# Altium footprint library FOOTPRINT.PcbLib: 132 footprints (part 8 of 9)
Each footprint in its own frame and in the unit in brackets; x right, y up, seen from the top. Pads: shape width x height; smd on the part's side, far side on the other; paste and mask are expansions set on the pad; w line width, h text height; cw(c..) or ccw(c..) is an arc to the next point about the centre after c.
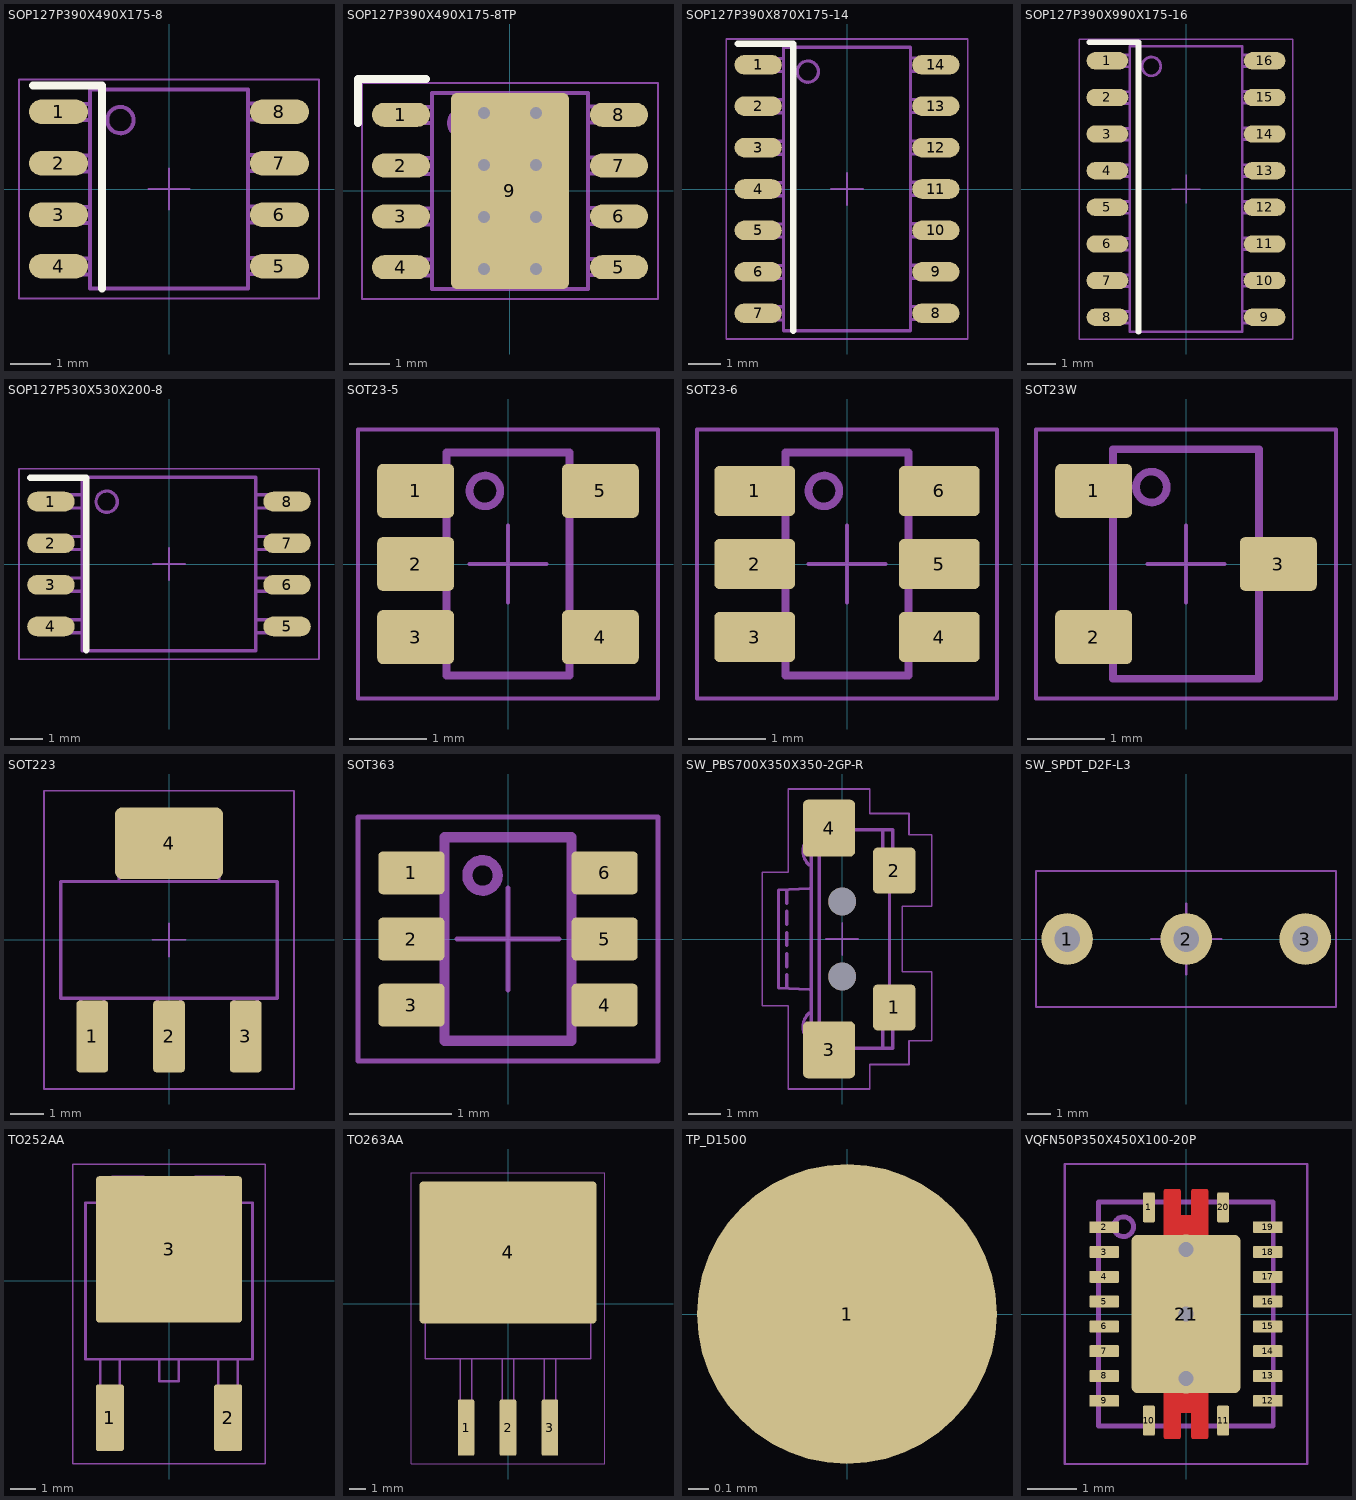
[diagram p7: the footprints below, top view; thin cyan lines are the x and y axes]

## SOP127P390X490X175-8 [mm] "Small Outline Package, 8-pin, 3.9x4.9mm"
height 1.75
pads (8):
  oval 1.45x0.6 smd: 1(-2.725,1.905) 2(-2.725,0.635) 3(-2.725,-0.635) 4(-2.725,-1.905) 5(2.725,-1.905) 6(2.725,-0.635) 7(2.725,0.635) 8(2.725,1.905)
Top Overlay:
  lines w0.2: -3.35,2.55 -1.65,2.55 -1.65,-2.45
Top Assembly:
  circle w0.1: c-1.2,1.7 r0.325
  lines w0.1: -1.95,-2.11 -3,-2.11 -3,-1.71 -1.95,-1.71 ; -1.95,-0.84 -3,-0.84 -3,-0.44 -1.95,-0.44 ; -1.95,0.43 -3,0.43 -3,0.83 -1.95,0.83 ; -1.95,1.7 -3,1.7 -3,2.1 -1.95,2.1 ; 1.95,-2.1 3,-2.1 3,-1.7 1.95,-1.7 ; 1.95,-0.83 3,-0.83 3,-0.43 1.95,-0.43 ; 1.95,0.44 3,0.44 3,0.84 1.95,0.84 ; 1.95,1.71 3,1.71 3,2.11 1.95,2.11 ; -1.95,-2.45 -1.95,2.45 1.95,2.45 1.95,-2.45 -1.95,-2.45
Top Courtyard:
  lines w0.05: -3.7,-2.7 3.7,-2.7 3.7,2.7 -3.7,2.7 -3.7,-2.7
Top Component Center:
  lines w0.05: -0.5,0 0.5,0 ; 0,-0.5 0,0.5
Top Designator:
  text "'.Comment'" at 0.81,-1.425 h0.65
  text "'.Designator'" at -0.351,-1.425 h0.65
3D body "SOIC-8_3.9x4.9mm_P1.27mm.step": height 1.75, standoff 0, extent -3,-2.45 3,2.45

## SOP127P390X490X175-8TP [mm] "Small Outline Package, Thermal Pad, 8-pin, 3.9x4.9mm"
height 1.75
pads (9):
  oval 1.45x0.6 smd: 1(-2.725,1.905) 2(-2.725,0.635) 3(-2.725,-0.635) 4(-2.725,-1.905) 5(2.725,-1.905) 6(2.725,-0.635) 7(2.725,0.635) 8(2.725,1.905)
  rrect10% 2.95x4.9 smd paste-100 mask-100: 9(0,0)
via 0.65,-1.95 diameter 0.6 hole 0.3
via -0.65,-1.95 diameter 0.6 hole 0.3
via -0.65,1.95 diameter 0.6 hole 0.3
via 0.65,1.95 diameter 0.6 hole 0.3
via 0.65,-0.65 diameter 0.6 hole 0.3
via -0.65,-0.65 diameter 0.6 hole 0.3
via -0.65,0.65 diameter 0.6 hole 0.3
via 0.65,0.65 diameter 0.6 hole 0.3
Top Overlay:
  lines w0.2: -3.8,1.7 -3.8,2.8 -2.1,2.8
Top Paste:
  region: -1.1,-1.55 1.1,-1.55 1.14,-1.55 1.213,-1.52 1.27,-1.463 1.3,-1.39 1.3,-1.35 1.3,1.35 1.3,1.39 1.27,1.463 1.213,1.52 1.14,1.55 1.1,1.55 -1.1,1.55 -1.14,1.55 -1.213,1.52 -1.27,1.463 -1.3,1.39 -1.3,1.35 -1.3,-1.35 -1.3,-1.39 -1.27,-1.463 -1.213,-1.52 -1.14,-1.55
Top Solder:
  region: -1.1,-1.55 1.1,-1.55 1.14,-1.55 1.213,-1.52 1.27,-1.463 1.3,-1.39 1.3,-1.35 1.3,1.35 1.3,1.39 1.27,1.463 1.213,1.52 1.14,1.55 1.1,1.55 -1.1,1.55 -1.14,1.55 -1.213,1.52 -1.27,1.463 -1.3,1.39 -1.3,1.35 -1.3,-1.35 -1.3,-1.39 -1.27,-1.463 -1.213,-1.52 -1.14,-1.55
Top Assembly:
  circle w0.1: c-1.2,1.7 r0.325
  lines w0.1: -1.95,-2.11 -3,-2.11 -3,-1.71 -1.95,-1.71 ; -1.95,-0.84 -3,-0.84 -3,-0.44 -1.95,-0.44 ; -1.95,0.43 -3,0.43 -3,0.83 -1.95,0.83 ; -1.95,1.7 -3,1.7 -3,2.1 -1.95,2.1 ; 1.95,-2.1 3,-2.1 3,-1.7 1.95,-1.7 ; 1.95,-0.83 3,-0.83 3,-0.43 1.95,-0.43 ; 1.95,0.44 3,0.44 3,0.84 1.95,0.84 ; 1.95,1.71 3,1.71 3,2.11 1.95,2.11 ; -1.95,-2.45 1.95,-2.45 1.95,2.45 -1.95,2.45 -1.95,-2.45
Top Courtyard:
  lines w0.05: -3.7,-2.7 -3.7,2.7 3.7,2.7 3.7,-2.7 -3.7,-2.7
Top Component Center:
  lines w0.05: -0.5,0 0.5,0 ; 0,-0.5 0,0.5
Top Designator:
  text "'.Designator'" at -0.351,-1.425 h0.65
  text "'.Comment'" at 0.81,-1.425 h0.65
3D body "SOIC-8_3.9x4.9mm_P1.27mm.step": height 1.75, standoff 0, extent -3,-2.45 3,2.45

## SOP127P390X870X175-14 [mm] "Small Outline Package, 14-pin, 3.9x8.7mm"
height 1.75
pads (14):
  oval 1.45x0.6 smd: 1(-2.725,3.81) 2(-2.725,2.54) 3(-2.725,1.27) 4(-2.725,0) 5(-2.725,-1.27) 6(-2.725,-2.54) 7(-2.725,-3.81) 8(2.725,-3.81) 9(2.725,-2.54) 10(2.725,-1.27) 11(2.725,0) 12(2.725,1.27) 13(2.725,2.54) 14(2.725,3.81)
Top Overlay:
  lines w0.2: -3.35,4.455 -1.65,4.455 -1.65,-4.35
Top Assembly:
  circle w0.1: c-1.2,3.6 r0.325
  lines w0.1: -1.95,-4.015 -3,-4.015 -3,-3.615 -1.95,-3.615 ; -1.95,-2.745 -3,-2.745 -3,-2.345 -1.95,-2.345 ; -1.95,-1.475 -3,-1.475 -3,-1.075 -1.95,-1.075 ; -1.95,-0.205 -3,-0.205 -3,0.195 -1.95,0.195 ; -1.95,1.065 -3,1.065 -3,1.465 -1.95,1.465 ; -1.95,2.335 -3,2.335 -3,2.735 -1.95,2.735 ; -1.95,3.605 -3,3.605 -3,4.005 -1.95,4.005 ; 1.95,-4.005 3,-4.005 3,-3.605 1.95,-3.605 ; 1.95,-2.735 3,-2.735 3,-2.335 1.95,-2.335 ; 1.95,-1.465 3,-1.465 3,-1.065 1.95,-1.065 ; 1.95,-0.195 3,-0.195 3,0.205 1.95,0.205 ; 1.95,1.075 3,1.075 3,1.475 1.95,1.475 ; 1.95,2.345 3,2.345 3,2.745 1.95,2.745 ; 1.95,3.615 3,3.615 3,4.015 1.95,4.015 ; -1.95,-4.35 -1.95,4.35 1.95,4.35 1.95,-4.35 -1.95,-4.35
Top Courtyard:
  lines w0.05: -3.7,-4.6 3.7,-4.6 3.7,4.6 -3.7,4.6 -3.7,-4.6
Top Component Center:
  lines w0.05: -0.5,0 0.5,0 ; 0,-0.5 0,0.5
Top Designator:
  text "'.Comment'" at 0.81,-1.425 h0.65
  text "'.Designator'" at -0.351,-1.425 h0.65
3D body "SOIC-14_3.9x8.7mm_P1.27mm.step": height 1.75, standoff 0, extent -3,-4.35 3,4.35

## SOP127P390X990X175-16 [mm] "Small Outline Package, 16-pin, 3.9x9.9mm"
height 1.75
pads (16):
  oval 1.45x0.6 smd: 1(-2.725,4.445) 2(-2.725,3.175) 3(-2.725,1.905) 4(-2.725,0.635) 5(-2.725,-0.635) 6(-2.725,-1.905) 7(-2.725,-3.175) 8(-2.725,-4.445) 9(2.725,-4.445) 10(2.725,-3.175) 11(2.725,-1.905) 12(2.725,-0.635) 13(2.725,0.635) 14(2.725,1.905) 15(2.725,3.175) 16(2.725,4.445)
Top Overlay:
  lines w0.2: -3.35,5.09 -1.65,5.09 -1.65,-4.95
Top Assembly:
  circle w0.1: c-1.2,4.25 r0.325
  lines w0.1: -1.95,-4.65 -3,-4.65 -3,-4.25 -1.95,-4.25 ; -1.95,-3.38 -3,-3.38 -3,-2.98 -1.95,-2.98 ; -1.95,-2.11 -3,-2.11 -3,-1.71 -1.95,-1.71 ; -1.95,-0.84 -3,-0.84 -3,-0.44 -1.95,-0.44 ; -1.95,0.43 -3,0.43 -3,0.83 -1.95,0.83 ; -1.95,1.7 -3,1.7 -3,2.1 -1.95,2.1 ; -1.95,2.97 -3,2.97 -3,3.37 -1.95,3.37 ; -1.95,4.24 -3,4.24 -3,4.64 -1.95,4.64 ; 1.95,-4.64 3,-4.64 3,-4.24 1.95,-4.24 ; 1.95,-3.37 3,-3.37 3,-2.97 1.95,-2.97 ; 1.95,-2.1 3,-2.1 3,-1.7 1.95,-1.7 ; 1.95,-0.83 3,-0.83 3,-0.43 1.95,-0.43 ; 1.95,0.44 3,0.44 3,0.84 1.95,0.84 ; 1.95,1.71 3,1.71 3,2.11 1.95,2.11 ; 1.95,2.98 3,2.98 3,3.38 1.95,3.38 ; 1.95,4.25 3,4.25 3,4.65 1.95,4.65 ; -1.95,-4.95 1.95,-4.95 1.95,4.95 -1.95,4.95 -1.95,-4.95
Top Courtyard:
  lines w0.05: -3.7,-5.2 -3.7,5.2 3.7,5.2 3.7,-5.2 -3.7,-5.2
Top Component Center:
  lines w0.05: -0.5,0 0.5,0 ; 0,-0.5 0,0.5
Top Designator:
  text "'.Designator'" at -0.351,-1.425 h0.65
  text "'.Comment'" at 0.81,-1.425 h0.65
3D body "SOIC-16_3.9x9.9mm_P1.27mm.step": height 1.75, standoff 0, extent -3,-4.95 3,4.95

## SOP127P530X530X200-8 [mm] "Small Outline Package, 8-pin, 5.30x5.30mm"
height 2
pads (8):
  oval 1.45x0.6 smd: 1(-3.6,1.905) 2(-3.6,0.635) 3(-3.6,-0.635) 4(-3.6,-1.905) 5(3.6,-1.905) 6(3.6,-0.635) 7(3.6,0.635) 8(3.6,1.905)
Top Overlay:
  lines w0.2: -4.225,2.625 -2.525,2.625 -2.525,-2.625
Top Assembly:
  circle w0.1: c-1.9,1.9 r0.325
  lines w0.1: -2.65,-2.1 -3.95,-2.1 -3.95,-1.7 -2.65,-1.7 ; -2.65,-0.83 -3.95,-0.83 -3.95,-0.43 -2.65,-0.43 ; -2.65,0.44 -3.95,0.44 -3.95,0.84 -2.65,0.84 ; -2.65,1.71 -3.95,1.71 -3.95,2.11 -2.65,2.11 ; 2.65,-2.1 3.95,-2.1 3.95,-1.7 2.65,-1.7 ; 2.65,-0.83 3.95,-0.83 3.95,-0.43 2.65,-0.43 ; 2.65,0.44 3.95,0.44 3.95,0.84 2.65,0.84 ; 2.65,1.71 3.95,1.71 3.95,2.11 2.65,2.11 ; -2.65,-2.65 -2.65,2.65 2.65,2.65 2.65,-2.65 -2.65,-2.65
Top Courtyard:
  lines w0.05: -4.575,-2.9 4.575,-2.9 4.575,2.9 -4.575,2.9 -4.575,-2.9
Top Component Center:
  lines w0.05: -0.5,0 0.5,0 ; 0,-0.5 0,0.5
Top Designator:
  text "'.Comment'" at 0.81,-1.425 h0.65
  text "'.Designator'" at -0.351,-1.425 h0.65
3D body "SOIC-8_5.275x5.275mm_P1.27mm.step": height 2.05, standoff 0, extent -3.95,-2.637 3.95,2.638

## SOT23-5 [mm] "Small Outline Transistor, 5-Leads, Body 2.9x1.6mm"
height 1.45
pads (5):
  rrect20% 1x0.7 smd: 1(-1.2,0.95) 2(-1.2,0) 3(-1.2,-0.95) 4(1.2,-0.95) 5(1.2,0.95)
Top Assembly:
  circle w0.1: c-0.3,0.95 r0.2
  lines w0.1: -1.15,-1.15 -1.15,-0.75 ; -1.15,-0.2 -1.15,0.2 ; -1.15,0.75 -1.15,1.15 ; -0.8,-1.15 -1.35,-1.15 -1.35,-0.75 -0.8,-0.75 ; -0.8,-0.2 -1.35,-0.2 -1.35,0.2 -0.8,0.2 ; -0.8,0.75 -1.35,0.75 -1.35,1.15 -0.8,1.15 ; 0.8,-1.15 1.35,-1.15 1.35,-0.75 0.8,-0.75 ; 0.8,0.75 1.35,0.75 1.35,1.15 0.8,1.15 ; 1.15,-1.15 1.15,-0.75 ; 1.15,0.75 1.15,1.15 ; -0.8,-1.45 -0.8,1.45 0.8,1.45 0.8,-1.45 -0.8,-1.45
Top Courtyard:
  lines w0.05: -1.95,-1.75 1.95,-1.75 1.95,1.75 -1.95,1.75 -1.95,-1.75
Top Component Center:
  lines w0.05: -0.5,0 0.5,0 ; 0,-0.5 0,0.5
Top Designator:
  text "'.Designator'" at -0.176,-1.325 h0.65
  text "'.Comment'" at 0.485,-1.325 h0.65
3D body "SOT-23-5.step": height 1.56, standoff 0.01, extent -1.4,-1.45 1.4,1.45

## SOT23-6 [mm] "Small Outline Transistor, 6-Leads, Body 2.9x1.6mm"
height 1.45
pads (6):
  rrect20% 1.05x0.65 smd: 1(-1.2,0.95) 2(-1.2,0) 3(-1.2,-0.95) 4(1.2,-0.95) 5(1.2,0) 6(1.2,0.95)
Top Assembly:
  circle w0.1: c-0.3,0.95 r0.2
  lines w0.1: -1.15,-1.15 -1.15,-0.75 ; -1.15,-0.2 -1.15,0.2 ; -1.15,0.75 -1.15,1.15 ; -0.8,-1.15 -1.35,-1.15 -1.35,-0.75 -0.8,-0.75 ; -0.8,-0.2 -1.35,-0.2 -1.35,0.2 -0.8,0.2 ; -0.8,0.75 -1.35,0.75 -1.35,1.15 -0.8,1.15 ; 0.8,-1.15 1.35,-1.15 1.35,-0.75 0.8,-0.75 ; 0.8,-0.2 1.35,-0.2 1.35,0.2 0.8,0.2 ; 0.8,0.75 1.35,0.75 1.35,1.15 0.8,1.15 ; 1.15,-1.15 1.15,-0.75 ; 1.15,-0.2 1.15,0.2 ; 1.15,0.75 1.15,1.15 ; -0.8,-1.45 -0.8,1.45 0.8,1.45 0.8,-1.45 -0.8,-1.45
Top Courtyard:
  lines w0.05: -1.95,-1.75 1.95,-1.75 1.95,1.75 -1.95,1.75 -1.95,-1.75
Top Component Center:
  lines w0.05: -0.5,0 0.5,0 ; 0,-0.5 0,0.5
Top Designator:
  text "'.Designator'" at -0.176,-1.375 h0.65
  text "'.Comment'" at 0.485,-1.375 h0.65
3D body "SOT-23-6.step": height 1.56, standoff 0.01, extent -1.4,-1.45 1.4,1.45

## SOT23W [mm] "Small Outline Transistor, 3-Leads, Body 2.98x1.91mm"
height 0.95
pads (3):
  rrect20% 1x0.7 smd: 1(-1.2,0.95) 2(-1.2,-0.95) 3(1.2,0)
Top Assembly:
  circle w0.1: c-0.45,1 r0.2
  lines w0.1: -1.3,-1.15 -1.3,-0.75 ; -1.3,0.75 -1.3,1.15 ; -0.95,-1.15 -1.5,-1.15 -1.5,-0.75 -0.95,-0.75 ; -0.95,0.75 -1.5,0.75 -1.5,1.15 -0.95,1.15 ; 0.95,-0.2 1.5,-0.2 1.5,0.2 0.95,0.2 ; 1.3,-0.2 1.3,0.2 ; -0.95,-1.49 0.95,-1.49 0.95,1.49 -0.95,1.49 -0.95,-1.49
Top Courtyard:
  lines w0.05: -1.95,-1.75 -1.95,1.75 1.95,1.75 1.95,-1.75 -1.95,-1.75
Top Component Center:
  lines w0.05: -0.5,0 0.5,0 ; 0,-0.5 0,0.5
Top Designator:
  text "'.Comment'" at 0.485,-1.45 h0.65
  text "'.Designator'" at -0.176,-1.45 h0.65
3D body "SOT-23W.step": height 1, standoff 0, extent -1.45,-1.49 1.45,1.49

## SOT223 [mm] "Small Outline Transistor, 4-Leads, Body 6.5x3.5mm"
height 1.6
pads (4):
  rrect20% 0.95x2.15 smd: 1(-2.3,-2.9) 2(0,-2.9) 3(2.3,-2.9)
  rrect20% 3.25x2.15 smd: 4(0,2.9)
Top Assembly:
  lines w0.1: -2.65,-2.625 -1.95,-2.625 ; -2.65,-1.75 -2.65,-3.5 -1.95,-3.5 -1.95,-1.75 ; -1.5,1.75 -1.5,3.5 1.5,3.5 1.5,1.75 ; -1.5,2.9 1.5,2.9 ; -0.35,-2.625 0.35,-2.625 ; -0.35,-1.75 -0.35,-3.5 0.35,-3.5 0.35,-1.75 ; 1.95,-2.625 2.65,-2.625 ; 1.95,-1.75 1.95,-3.5 2.65,-3.5 2.65,-1.75 ; -3.25,-1.75 -3.25,1.75 3.25,1.75 3.25,-1.75 -3.25,-1.75
Top Courtyard:
  lines w0.05: -3.75,-4.475 -3.75,4.475 3.75,4.475 3.75,-4.475 -3.75,-4.475
Top Component Center:
  lines w0.05: -0.5,0 0.5,0 ; 0,-0.5 0,0.5
Top Designator:
  text "'.Designator'" at -1.875,0.176 h0.65
  text "'.Comment'" at -1.875,-0.485 h0.65
3D body "SOT-223.step": height 1.7, standoff 0, extent -3.25,-3.5 3.25,3.5

## SOT363 [mm] "Small Outline Transistor, 6-Leads, Body 2.00x1.25mm"
height 0.95
pads (6):
  rrect20% 0.65x0.42 smd: 1(-0.95,0.65) 2(-0.95,0) 3(-0.95,-0.65) 4(0.95,-0.65) 5(0.95,0) 6(0.95,0.65)
Top Assembly:
  circle w0.1: c-0.25,0.625 r0.15
  lines w0.1: -0.85,-0.8 -0.85,-0.5 ; -0.85,-0.15 -0.85,0.15 ; -0.85,0.5 -0.85,0.8 ; -0.625,-0.8 -1,-0.8 -1,-0.5 -0.625,-0.5 ; -0.625,-0.15 -1,-0.15 -1,0.15 -0.625,0.15 ; -0.625,0.5 -1,0.5 -1,0.8 -0.625,0.8 ; 0.625,-0.8 1,-0.8 1,-0.5 0.625,-0.5 ; 0.625,-0.15 1,-0.15 1,0.15 0.625,0.15 ; 0.625,0.5 1,0.5 1,0.8 0.625,0.8 ; 0.85,-0.8 0.85,-0.5 ; 0.85,-0.15 0.85,0.15 ; 0.85,0.5 0.85,0.8 ; -0.625,-1 -0.625,1 0.625,1 0.625,-1 -0.625,-1
Top Courtyard:
  lines w0.05: -1.475,-1.2 -1.475,1.2 1.475,1.2 1.475,-1.2 -1.475,-1.2
Top Component Center:
  lines w0.05: -0.5,0 0.5,0 ; 0,-0.5 0,0.5
Top Designator:
  text "'.Designator'" at -0.176,-0.9 h0.65
  text "'.Comment'" at 0.485,-0.9 h0.65
3D body "SOT-363_SC-70-6.step": height 1.06, standoff 0.01, extent -1,-1 1,1

## SW_PBS700X350X350-2GP-R [mm] "Push Button Switch, Body 7.0x3.5mm, 2 pin GND, 2 Mounting Holes"
height 3.5
pads (6):
  rrect20% 1.3x1.4 smd: 1(1.6,-2.1) 2(1.6,2.1)
  rrect20% 1.6x1.75 smd: 3(-0.4,-3.4) 4(-0.4,3.4)
  round 0.85 hole 0.85 unplated: ""(0,-1.15) ""(0,1.15)
Top Assembly:
  lines w0.1: -1.7,-1.5 -1.7,-1.1 ; -1.7,-0.85 -1.7,-0.45 ; -1.7,-0.2 -1.7,0.2 ; -1.7,0.45 -1.7,0.85 ; -1.7,1.1 -1.7,1.5 ; -1.024,-3.124 cw(c-0.6,-2.7) -1.024,-2.276 ; -1.024,2.276 cw(c-0.6,2.7) -1.024,3.124 ; -1,-1.55 -1.95,-1.5 -1.95,1.5 -1,1.55 ; -0.7,-3.35 1.55,-3.35 1.55,-1.6 1.25,-1.6 1.25,-1.8 ; -0.7,3.35 1.55,3.35 1.55,1.6 1.25,1.6 1.25,1.8 ; 1.25,-3.35 1.25,-2.4 ; 1.25,2.4 1.25,3.35 ; 1.45,-1.6 1.45,1.6 ; 1.55,-2.4 1.85,-2.4 1.85,-1.8 1.55,-1.8 ; 1.55,1.8 1.85,1.8 1.85,2.4 1.55,2.4 ; -0.95,-3.5 ccw(c-0.55,-3.5) -0.55,-3.9 -0.15,-3.9 -0.15,-3.6 -0.6,-3.6 cw(c-0.6,-3.5) -0.7,-3.5 ; -0.95,-3.5 -0.7,-3.5 ; -0.95,-3.5 -0.95,3.5 ; -0.95,3.5 cw(c-0.55,3.5) -0.55,3.9 -0.15,3.9 -0.15,3.6 -0.6,3.6 ccw(c-0.6,3.5) -0.7,3.5 ; -0.95,3.5 -0.7,3.5 ; -0.7,-3.5 -0.7,3.5 ; 1.2,-2.4 1.35,-2.4 1.35,-1.8 1.2,-1.8 1.2,-2.4 ; 1.2,1.8 1.35,1.8 1.35,2.4 1.2,2.4 1.2,1.8
Top Courtyard:
  lines w0.05: -2.45,-2.05 -2.45,-1.5 -2.45,1.5 -2.45,2.05 -1.95,2.05 -1.65,2.05 -1.65,4.6 0.85,4.6 0.85,3.85 2.05,3.85 2.05,3.2 2.75,3.2 2.75,1 1.85,1 1.85,-1 2.75,-1 2.75,-3.125 2.05,-3.125 2.05,-3.85 1.55,-3.85 0.85,-3.85 0.85,-4.6 0.05,-4.6 -1.65,-4.6 -1.65,-2.7 -1.65,-2.05 -2.45,-2.05
Top Component Center:
  lines w0.05: -0.5,0 0.5,0 ; 0,-0.5 0,0.5
Top Designator:
  text "'.Comment'" at 1.357,-1.65 h0.65
  text "'.Designator'" at 0.746,-1.65 h0.65

## SW_SPDT_D2F-L3 [mm]
pads (3):
  round 2.2 hole 1.1: 1(-5.08,0) 2(0,0) 3(5.08,0)
Top Assembly:
  lines w0.1: -6.41,-2.9 -6.41,2.9 6.39,2.9 6.39,-2.9 -6.41,-2.9
Top Component Center:
  lines w0.1: -1.5,0 1.5,0 ; 0,-1.5 0,1.5
Top Designator:
  text "'.Comment'" at -4.025,-0.532 h0.65
  text "'.Designator'" at -4.025,0.079 h0.65
3D body "D2F-L3.STEP": height 12.4, standoff -3.3, extent -6.45,-2.9 9.718,2.9

## TO252AA [mm] "DPAK"
pads (3):
  rrect20% 1.1x2.6 smd: 1(-2.3,-5.325) 2(2.3,-5.325)
  rrect5% 5.7x5.7 smd paste-10: 3(0,1.225)
Top Paste:
  region: -2.55,-1.625 -0.25,-1.625 -0.25,0.975 -2.85,0.975 -2.85,-1.325 -2.85,-1.385 -2.804,-1.495 -2.72,-1.579 -2.61,-1.625
  region: 2.55,4.075 0.25,4.075 0.25,1.475 2.85,1.475 2.85,3.775 2.85,3.835 2.804,3.945 2.72,4.029 2.61,4.075
  region: -2.85,3.775 -2.85,1.475 -0.25,1.475 -0.25,4.075 -2.55,4.075 -2.61,4.075 -2.72,4.029 -2.804,3.945 -2.85,3.835
  region: 2.85,-1.325 2.85,0.975 0.25,0.975 0.25,-1.625 2.55,-1.625 2.61,-1.625 2.72,-1.579 2.804,-1.495 2.85,-1.385
Top Assembly:
  lines w0.1: -2.7,3.05 -2.7,3.55 -2.2,4.05 -0.975,4.05 -0.975,3.65 1.025,3.65 1.025,4.05 2.15,4.05 2.7,3.5 2.7,3.05 ; -2.675,-3.05 -2.675,-5.85 -1.925,-5.85 -1.925,-3.05 ; -0.375,-3.05 -0.375,-3.9 0.375,-3.9 0.375,-3.05 ; 1.925,-3.05 1.925,-5.85 2.675,-5.85 2.675,-3.05 ; 2.7,3.05 2.8,3.05 3.25,3.05 3.25,-3.05 -3.25,-3.05 -3.25,3.05 2.7,3.05
Top Courtyard:
  lines w0.05: -3.75,-7.125 -3.75,4.55 3.75,4.55 3.75,-7.125 -3.75,-7.125
Top Component Center:
  lines w0.05: -1,0 1,0 ; 0,-1 0,1
Top Designator:
  text "'.Comment'" at -1.35,0.49 h0.65
  text "'.Designator'" at -1.35,1.151 h0.65
3D body "TO-252-2.step": height 2.32, standoff 0, extent -3.25,-5.85 3.25,4.05

## TO263AA [mm] "DDPAK"
pads (4):
  rrect20% 1x3.4 smd: 1(-2.54,-7.5) 2(0,-7.5) 3(2.54,-7.5)
  rrect5% 10.7x8.6 smd paste-10: 4(0,3.1)
Top Paste:
  region: -5.125,7.4 -0.25,7.4 -0.25,3.35 -5.35,3.35 -5.35,7.175 -5.35,7.22 -5.316,7.302 -5.252,7.366 -5.17,7.4
  region: 5.125,7.4 0.25,7.4 0.25,3.35 5.35,3.35 5.35,7.175 5.35,7.22 5.316,7.302 5.252,7.366 5.17,7.4
  region: -5.125,-1.2 -0.25,-1.2 -0.25,2.85 -5.35,2.85 -5.35,-0.975 -5.35,-1.02 -5.316,-1.102 -5.252,-1.166 -5.17,-1.2
  region: 5.125,-1.2 0.25,-1.2 0.25,2.85 5.35,2.85 5.35,-0.975 5.35,-1.02 5.316,-1.102 5.252,-1.166 5.17,-1.2
Top Assembly:
  lines w0.1: -2.88,-3.325 -2.88,-8.55 -2.2,-8.55 -2.2,-3.325 ; -0.34,-3.325 -0.34,-8.55 0.34,-8.55 0.34,-3.325 ; 2.2,-3.325 2.2,-8.55 2.88,-8.55 2.88,-3.325 ; -5,5.325 -5,-3.325 5,-3.325 5,5.325 ; -5,5.325 -5,5.325 ; -5,5.325 -5,6.075 -3.4,6.45 3.4,6.45 5,6.075 5,5.325 ; -5,5.325 5,5.325
Top Courtyard:
  lines w0.05: -5.85,-9.7 5.85,-9.7 5.85,7.925 -5.85,7.925 -5.85,-9.7
Top Component Center:
  lines w0.05: -1,0 1,0 ; 0,-1 0,1
Top Designator:
  text "'.Comment'" at -1.35,0.49 h0.65
  text "'.Designator'" at -1.35,1.151 h0.65
3D body "TO-263-3_TabPin4.step": height 4.42, standoff 0, extent -5,-8.55 5,6.45

## TP_D1500 [mm] "Test Point, Round, D1.5mm"
pads (1):
  round 1.5 smd paste-10: 1(0,0)

## VQFN50P350X450X100-20P [mm] "VQFN20, 21-Leads, Thermal Pad, Body 3.50x4.50mm"
height 1
pads (21):
  rrect20% 0.24x0.6 smd paste+0 mask+0.07: 1(-0.75,2.15) 10(-0.75,-2.15) 11(0.75,-2.15) 20(0.75,2.15)
  rrect20% 0.6x0.24 smd paste+0 mask+0.07: 2(-1.65,1.75) 3(-1.65,1.25) 4(-1.65,0.75) 5(-1.65,0.25) 6(-1.65,-0.25) 7(-1.65,-0.75) 8(-1.65,-1.25) 9(-1.65,-1.75) 12(1.65,-1.75) 13(1.65,-1.25) 14(1.65,-0.75) 15(1.65,-0.25) 16(1.65,0.25) 17(1.65,0.75) 18(1.65,1.25) 19(1.65,1.75)
  rrect10% 2.19x3.19 smd paste-100 mask-0.07: 21(0,0)
via 0,-1.3 diameter 0.6 hole 0.3
via 0,0 diameter 0.6 hole 0.3
via 0,1.3 diameter 0.6 hole 0.3
Top:
  region: 0.405,-2.52 0.145,-2.52 0.137,-2.52 0.122,-2.514 0.111,-2.503 0.105,-2.488 0.105,-2.48 0.105,-1.995 -0.105,-1.995 -0.105,-2.48 -0.105,-2.488 -0.111,-2.503 -0.122,-2.514 -0.137,-2.52 -0.145,-2.52 -0.405,-2.52 -0.413,-2.52 -0.428,-2.514 -0.439,-2.503 -0.445,-2.488 -0.445,-2.48 -0.445,-1.575 0.445,-1.575 0.445,-2.48 0.445,-2.488 0.439,-2.503 0.428,-2.514 0.413,-2.52
  region: 0.405,2.52 0.145,2.52 0.137,2.52 0.122,2.514 0.111,2.503 0.105,2.488 0.105,2.48 0.105,1.995 -0.105,1.995 -0.105,2.48 -0.105,2.488 -0.111,2.503 -0.122,2.514 -0.137,2.52 -0.145,2.52 -0.405,2.52 -0.413,2.52 -0.428,2.514 -0.439,2.503 -0.445,2.488 -0.445,2.48 -0.445,1.575 0.445,1.575 0.445,2.48 0.445,2.488 0.439,2.503 0.428,2.514 0.413,2.52
Top Paste:
  drawing of 8 lines, arcs and shapes, not listed
Top Solder:
  region: -0.375,-1.5 -0.375,-2.425 -0.375,-2.43 -0.371,-2.439 -0.364,-2.446 -0.355,-2.45 -0.35,-2.45 -0.2,-2.45 -0.195,-2.45 -0.186,-2.446 -0.179,-2.439 -0.175,-2.43 -0.175,-2.425 -0.175,-1.925 0.175,-1.925 0.175,-2.425 0.175,-2.43 0.179,-2.439 0.186,-2.446 0.195,-2.45 0.2,-2.45 0.35,-2.45 0.355,-2.45 0.364,-2.446 0.371,-2.439 0.375,-2.43 0.375,-2.425 0.375,-1.5
  region: -0.375,1.5 -0.375,2.425 -0.375,2.43 -0.371,2.439 -0.364,2.446 -0.355,2.45 -0.35,2.45 -0.2,2.45 -0.195,2.45 -0.186,2.446 -0.179,2.439 -0.175,2.43 -0.175,2.425 -0.175,1.925 0.175,1.925 0.175,2.425 0.175,2.43 0.179,2.439 0.186,2.446 0.195,2.45 0.2,2.45 0.35,2.45 0.355,2.45 0.364,2.446 0.371,2.439 0.375,2.43 0.375,2.425 0.375,1.5
Top Assembly:
  circle w0.1: c-1.26,1.76 r0.2
  lines w0.1: -1.76,-2.26 -1.76,2.26 1.76,2.26 1.76,-2.26 -1.76,-2.26
Top Courtyard:
  lines w0.05: -2.45,-3.025 -2.45,3.025 2.45,3.025 2.45,-3.025 -2.45,-3.025
Top Component Center:
  lines w0.05: -0.5,0 0.5,0 ; 0,-0.5 0,0.5
Top Designator:
  text "'.Comment'" at 0.81,-2.025 h0.65
  text "'.Designator'" at -0.351,-2.025 h0.65
3D body "VQFN50P350X450X100-21TP.x_t": height 1.01, standoff 0.01, extent -1.76,-2.26 1.76,2.26